# Altium schematic symbol library Analog Devices Operational Amplifiers.SchLib: 2102 symbols (part 18 of 35) (continued)
## AD8624ACPZ-R7
designator U?
Quad Channel Low Offset Voltage Operational Amplifier, 560 KHz BW, 480 mV/us SR, Industrial, 16-pin QFN (CP-16-17), Reel; Generic Part Number: AD8624; Manufacturer: Analog Devices; PartNumber: AD8624ACPZ-R7; Amplifiers Per Package: 4; Input Bias Current: 45pA; Input Offset Voltage: 10uV; Iq/Amp: 215uA; Small Signal Bandwidth: 560KHz; V Span Max: 36V; V Span Min: 4V; DatasheetVersion: Rev. C; PackageVersion: 08-16-2010-C; PackageReference: CP-16-17; PackageDescription: 16-Pin Lead Frame Chip Scale Package, Body 4 x 4 mm, Pitch 0.65 mm; Supplier 1: Digi-Key; Supplier Part Number 1: AD8624ACPZ-R7-ND; Supplier 2: Newark; Supplier Part Number 2: 67R2269; Packing: Reel; Slew Rate: 480mV/us; Mounting Technology: Surface Mount; Code_JEDEC: MO-220-WGGC; ComponentLink1Description: Manufacturer URL; ComponentLink1URL: http://www.analog.com/en/index.html; ComponentLink2Description: Datasheet; ComponentLink2URL: http://www.analog.com/static/imported-files/data_sheets/AD8622_8624.pdf; ComponentLink3Description: Package Specification; ComponentLink3URL: http://www.analog.com/static/imported-files/packages/PKG_PDF/LFCSP(CP)/CP_16_17.pdf
footprint ADI-CP-16-17_N (QFN, 16-Leads, Body 4x4mm, Pitch 0.65mm, Thermal Pad 2.60x2.60mm, IPC Medium Density)
footprint ADI-CP-16-17_L (QFN, 16-Leads, Body 4x4mm, Pitch 0.65mm, Thermal Pad 2.60x2.60mm, IPC High Density)
footprint ADI-CP-16-17_M (QFN, 16-Leads, Body 4x4mm, Pitch 0.65mm, Thermal Pad 2.60x2.60mm, IPC Low Density)
part A pins: 1 -IN A (in), 2 +IN A (in), 15 OUT A (out)
part B pins: 4 +IN B (in), 5 -IN B (in), 6 OUT B (out)
part C pins: 7 OUT C (out), 8 -IN C (in), 9 +IN C (in)
part D pins: 11 +IN D (in), 12 -IN D (in), 14 OUT D (out)
part E pins: 3 +V (power), 10 -V (power), 13 NC, 16 NC, 17 EP (power) "IT IS RECOMMENDED THAT THE EXPOSED PAD BE CONNECTED TO V-."

## AD8624ACPZ-RL
designator U?
Quad Channel Low Offset Voltage Operational Amplifier, 560 KHz BW, 480 mV/us SR, Industrial, 16-pin QFN (CP-16-17), Reel; Generic Part Number: AD8624; Manufacturer: Analog Devices; PartNumber: AD8624ACPZ-RL; Amplifiers Per Package: 4; Input Bias Current: 45pA; Input Offset Voltage: 10uV; Iq/Amp: 215uA; Small Signal Bandwidth: 560KHz; V Span Max: 36V; V Span Min: 4V; DatasheetVersion: Rev. C; PackageVersion: 08-16-2010-C; PackageReference: CP-16-17; PackageDescription: 16-Pin Lead Frame Chip Scale Package, Body 4 x 4 mm, Pitch 0.65 mm; Supplier 1: Digi-Key; Supplier Part Number 1: AD8624ACPZ-RL-ND; Supplier 2: Newark; Supplier Part Number 2: 67R2267; Packing: Reel; Slew Rate: 480mV/us; Mounting Technology: Surface Mount; Code_JEDEC: MO-220-WGGC; ComponentLink1Description: Manufacturer URL; ComponentLink1URL: http://www.analog.com/en/index.html; ComponentLink2Description: Datasheet; ComponentLink2URL: http://www.analog.com/static/imported-files/data_sheets/AD8622_8624.pdf; ComponentLink3Description: Package Specification; ComponentLink3URL: http://www.analog.com/static/imported-files/packages/PKG_PDF/LFCSP(CP)/CP_16_17.pdf
footprint ADI-CP-16-17_N (QFN, 16-Leads, Body 4x4mm, Pitch 0.65mm, Thermal Pad 2.60x2.60mm, IPC Medium Density)
footprint ADI-CP-16-17_L (QFN, 16-Leads, Body 4x4mm, Pitch 0.65mm, Thermal Pad 2.60x2.60mm, IPC High Density)
footprint ADI-CP-16-17_M (QFN, 16-Leads, Body 4x4mm, Pitch 0.65mm, Thermal Pad 2.60x2.60mm, IPC Low Density)
part A pins: 1 -IN A (in), 2 +IN A (in), 15 OUT A (out)
part B pins: 4 +IN B (in), 5 -IN B (in), 6 OUT B (out)
part C pins: 7 OUT C (out), 8 -IN C (in), 9 +IN C (in)
part D pins: 11 +IN D (in), 12 -IN D (in), 14 OUT D (out)
part E pins: 3 +V (power), 10 -V (power), 13 NC, 16 NC, 17 EP (power) "IT IS RECOMMENDED THAT THE EXPOSED PAD BE CONNECTED TO V-."

## AD8624ARUZ
designator U?
Quad Channel Low Offset Voltage Operational Amplifier, 560 KHz BW, 480 mV/us SR, Industrial, 14-pin SOP (RU-14), Tube; Generic Part Number: AD8624; Manufacturer: Analog Devices; PartNumber: AD8624ARUZ; Amplifiers Per Package: 4; Input Bias Current: 45pA; Input Offset Voltage: 10uV; Iq/Amp: 215uA; Small Signal Bandwidth: 560KHz; V Span Max: 36V; V Span Min: 4V; DatasheetVersion: Rev. C; PackageReference: RU-14; PackageDescription: 14-Pin Thin Shrink Small Outline Package, Body 5 x 4.4 mm, Pitch 0.65 mm; Supplier 1: Digi-Key; Supplier Part Number 1: AD8624ARUZ-ND; Supplier 2: Farnell; Supplier Part Number 2: 1827371; Supplier 3: Newark; Supplier Part Number 3: 67R2270; Packing: Tube; Slew Rate: 480mV/us; Mounting Technology: Surface Mount; Code_JEDEC: MO-153AB-1; ComponentLink1Description: Manufacturer URL; ComponentLink1URL: http://www.analog.com/en/index.html; ComponentLink2Description: Datasheet; ComponentLink2URL: http://www.analog.com/static/imported-files/data_sheets/AD8622_8624.pdf; ComponentLink3Description: Package Specification; ComponentLink3URL: http://www.analog.com/static/imported-files/packages/36057385283879153717235186773RU14.pdf
footprint ADI-RU-14_N (SOP, 14-Leads, Body 5x4.4mm, Pitch 0.65mm, IPC Medium Density)
footprint ADI-RU-14_L (SOP, 14-Leads, Body 5x4.4mm, Pitch 0.65mm, IPC High Density)
footprint ADI-RU-14_M (SOP, 14-Leads, Body 5x4.4mm, Pitch 0.65mm, IPC Low Density)
pins on every part: 4 +V (power), 11 -V (power)
part A pins: 1 OUT A (out), 2 -IN A (in), 3 +IN A (in)
part B pins: 5 +IN B (in), 6 -IN B (in), 7 OUT B (out)
part C pins: 8 OUT C (out), 9 -IN C (in), 10 +IN C (in)
part D pins: 12 +IN D (in), 13 -IN D (in), 14 OUT D (out)

## AD8624ARUZ-RL
designator U?
Quad Channel Low Offset Voltage Operational Amplifier, 560 KHz BW, 480 mV/us SR, Industrial, 14-pin SOP (RU-14), Reel; Generic Part Number: AD8624; Manufacturer: Analog Devices; PartNumber: AD8624ARUZ-RL; Amplifiers Per Package: 4; Input Bias Current: 45pA; Input Offset Voltage: 10uV; Iq/Amp: 215uA; Small Signal Bandwidth: 560KHz; V Span Max: 36V; V Span Min: 4V; DatasheetVersion: Rev. C; PackageReference: RU-14; PackageDescription: 14-Pin Thin Shrink Small Outline Package, Body 5 x 4.4 mm, Pitch 0.65 mm; Supplier 1: Digi-Key; Supplier Part Number 1: AD8624ARUZ-RL-ND; Supplier 2: Newark; Supplier Part Number 2: 67R2271; Packing: Reel; Slew Rate: 480mV/us; Mounting Technology: Surface Mount; Code_JEDEC: MO-153AB-1; ComponentLink1Description: Manufacturer URL; ComponentLink1URL: http://www.analog.com/en/index.html; ComponentLink2Description: Datasheet; ComponentLink2URL: http://www.analog.com/static/imported-files/data_sheets/AD8622_8624.pdf; ComponentLink3Description: Package Specification; ComponentLink3URL: http://www.analog.com/static/imported-files/packages/36057385283879153717235186773RU14.pdf
footprint ADI-RU-14_N (SOP, 14-Leads, Body 5x4.4mm, Pitch 0.65mm, IPC Medium Density)
footprint ADI-RU-14_L (SOP, 14-Leads, Body 5x4.4mm, Pitch 0.65mm, IPC High Density)
footprint ADI-RU-14_M (SOP, 14-Leads, Body 5x4.4mm, Pitch 0.65mm, IPC Low Density)
pins on every part: 4 +V (power), 11 -V (power)
part A pins: 1 OUT A (out), 2 -IN A (in), 3 +IN A (in)
part B pins: 5 +IN B (in), 6 -IN B (in), 7 OUT B (out)
part C pins: 8 OUT C (out), 9 -IN C (in), 10 +IN C (in)
part D pins: 12 +IN D (in), 13 -IN D (in), 14 OUT D (out)

## AD8625ARUZ
designator U?
Quad Channel Very Low Input Bias Current Operational Amplifier, 5 MHz BW, 5 V/us SR, Industrial, 14-pin SOP (RU-14), Tube; Generic Part Number: AD8625; Manufacturer: Analog Devices; PartNumber: AD8625ARUZ; Amplifiers Per Package: 4; Input Bias Current: 250fA; Input Offset Voltage: 50uV; Iq/Amp: 850uA; Slew Rate: 5V/us; Small Signal Bandwidth: 5MHz; V Span Max: 26V; V Span Min: 5V; DatasheetVersion: Rev. E; PackageReference: RU-14; PackageDescription: 14-Pin Thin Shrink Small Outline Package, Body 5 x 4.4 mm, Pitch 0.65 mm; Supplier 1: Digi-Key; Supplier Part Number 1: AD8625ARUZ-ND; Supplier 2: Newark; Supplier Part Number 2: 59K6979; Mounting Technology: Surface Mount; Code_JEDEC: MO-153AB-1; ComponentLink1Description: Manufacturer URL; ComponentLink1URL: http://www.analog.com/en/index.html; ComponentLink2Description: Datasheet; ComponentLink2URL: http://www.analog.com/static/imported-files/data_sheets/AD8625_8626_8627.pdf; ComponentLink3Description: Package Specification; ComponentLink3URL: http://www.analog.com/static/imported-files/packages/36057385283879153717235186773RU14.pdf
footprint ADI-RU-14_N (SOP, 14-Leads, Body 5x4.4mm, Pitch 0.65mm, IPC Medium Density)
footprint ADI-RU-14_L (SOP, 14-Leads, Body 5x4.4mm, Pitch 0.65mm, IPC High Density)
footprint ADI-RU-14_M (SOP, 14-Leads, Body 5x4.4mm, Pitch 0.65mm, IPC Low Density)
pins on every part: 4 +V (power), 11 -V (power)
part A pins: 1 OUT A (out), 2 -IN A (in), 3 +IN A (in)
part B pins: 5 +IN B (in), 6 -IN B (in), 7 OUT B (out)
part C pins: 8 OUT C (out), 9 -IN C (in), 10 +IN C (in)
part D pins: 12 +IN D (in), 13 -IN D (in), 14 OUT D (out)

## AD8625ARUZ-REEL
designator U?
Quad Channel Very Low Input Bias Current Operational Amplifier, 5 MHz BW, 5 V/us SR, Industrial, 14-pin SOP (RU-14), Reel; Generic Part Number: AD8625; Manufacturer: Analog Devices; PartNumber: AD8625ARUZ-REEL; Amplifiers Per Package: 4; Input Bias Current: 250fA; Input Offset Voltage: 50uV; Iq/Amp: 850uA; Slew Rate: 5V/us; Small Signal Bandwidth: 5MHz; V Span Max: 26V; V Span Min: 5V; DatasheetVersion: Rev. E; PackageReference: RU-14; PackageDescription: 14-Pin Thin Shrink Small Outline Package, Body 5 x 4.4 mm, Pitch 0.65 mm; Supplier 1: Digi-Key; Supplier Part Number 1: AD8625ARUZ-REEL-ND; Mounting Technology: Surface Mount; Code_JEDEC: MO-153AB-1; ComponentLink1Description: Manufacturer URL; ComponentLink1URL: http://www.analog.com/en/index.html; ComponentLink2Description: Datasheet; ComponentLink2URL: http://www.analog.com/static/imported-files/data_sheets/AD8625_8626_8627.pdf; ComponentLink3Description: Package Specification; ComponentLink3URL: http://www.analog.com/static/imported-files/packages/36057385283879153717235186773RU14.pdf
footprint ADI-RU-14_N (SOP, 14-Leads, Body 5x4.4mm, Pitch 0.65mm, IPC Medium Density)
footprint ADI-RU-14_L (SOP, 14-Leads, Body 5x4.4mm, Pitch 0.65mm, IPC High Density)
footprint ADI-RU-14_M (SOP, 14-Leads, Body 5x4.4mm, Pitch 0.65mm, IPC Low Density)
pins on every part: 4 +V (power), 11 -V (power)
part A pins: 1 OUT A (out), 2 -IN A (in), 3 +IN A (in)
part B pins: 5 +IN B (in), 6 -IN B (in), 7 OUT B (out)
part C pins: 8 OUT C (out), 9 -IN C (in), 10 +IN C (in)
part D pins: 12 +IN D (in), 13 -IN D (in), 14 OUT D (out)

## AD8625ARZ
designator U?
Quad Channel Very Low Input Bias Current Operational Amplifier, 5 MHz BW, 5 V/us SR, Industrial, 14-pin SOIC (R-14), Tube; Generic Part Number: AD8625; Manufacturer: Analog Devices; PartNumber: AD8625ARZ; Amplifiers Per Package: 4; Input Bias Current: 250fA; Input Offset Voltage: 50uV; Iq/Amp: 850uA; Slew Rate: 5V/us; Small Signal Bandwidth: 5MHz; V Span Max: 26V; V Span Min: 5V; DatasheetVersion: Rev. E; PackageVersion: 060606-A; PackageReference: R-14; PackageDescription: 14-Pin Standard Small Outline Package, Body 8.65 x 3.9 mm, Pitch 1.27 mm; Supplier 1: Digi-Key; Supplier Part Number 1: AD8625ARZ-ND; Supplier 2: Farnell; Supplier Part Number 2: 1581953; Supplier 3: Newark; Supplier Part Number 3: 59K6981; Mounting Technology: Surface Mount; Code_JEDEC: MS-012-AB; ComponentLink1Description: Manufacturer URL; ComponentLink1URL: http://www.analog.com/en/index.html; ComponentLink2Description: Datasheet; ComponentLink2URL: http://www.analog.com/static/imported-files/data_sheets/AD8625_8626_8627.pdf; ComponentLink3Description: Package Specification; ComponentLink3URL: http://www.analog.com/static/imported-files/packages/PKG_PDF/SOIC_Narrow%20(R)/R_14.pdf
footprint ADI-R-14_N (SOIC, 14-Leads, Body 8.65x3.9mm, Pitch 1.27mm, IPC Medium Density)
footprint ADI-R-14_L (SOIC, 14-Leads, Body 8.65x3.9mm, Pitch 1.27mm, IPC High Density)
footprint ADI-R-14_M (SOIC, 14-Leads, Body 8.65x3.9mm, Pitch 1.27mm, IPC Low Density)
pins on every part: 4 +V (power), 11 -V (power)
part A pins: 1 OUT A (out), 2 -IN A (in), 3 +IN A (in)
part B pins: 5 +IN B (in), 6 -IN B (in), 7 OUT B (out)
part C pins: 8 OUT C (out), 9 -IN C (in), 10 +IN C (in)
part D pins: 12 +IN D (in), 13 -IN D (in), 14 OUT D (out)

## AD8625ARZ-REEL
designator U?
Quad Channel Very Low Input Bias Current Operational Amplifier, 5 MHz BW, 5 V/us SR, Industrial, 14-pin SOIC (R-14), Reel; Generic Part Number: AD8625; Manufacturer: Analog Devices; PartNumber: AD8625ARZ-REEL; Amplifiers Per Package: 4; Input Bias Current: 250fA; Input Offset Voltage: 50uV; Iq/Amp: 850uA; Slew Rate: 5V/us; Small Signal Bandwidth: 5MHz; V Span Max: 26V; V Span Min: 5V; DatasheetVersion: Rev. E; PackageVersion: 060606-A; PackageReference: R-14; PackageDescription: 14-Pin Standard Small Outline Package, Body 8.65 x 3.9 mm, Pitch 1.27 mm; Supplier 1: Digi-Key; Supplier Part Number 1: AD8625ARZ-REEL-ND; Mounting Technology: Surface Mount; Code_JEDEC: MS-012-AB; ComponentLink1Description: Manufacturer URL; ComponentLink1URL: http://www.analog.com/en/index.html; ComponentLink2Description: Datasheet; ComponentLink2URL: http://www.analog.com/static/imported-files/data_sheets/AD8625_8626_8627.pdf; ComponentLink3Description: Package Specification; ComponentLink3URL: http://www.analog.com/static/imported-files/packages/PKG_PDF/SOIC_Narrow%20(R)/R_14.pdf
footprint ADI-R-14_N (SOIC, 14-Leads, Body 8.65x3.9mm, Pitch 1.27mm, IPC Medium Density)
footprint ADI-R-14_L (SOIC, 14-Leads, Body 8.65x3.9mm, Pitch 1.27mm, IPC High Density)
footprint ADI-R-14_M (SOIC, 14-Leads, Body 8.65x3.9mm, Pitch 1.27mm, IPC Low Density)
pins on every part: 4 +V (power), 11 -V (power)
part A pins: 1 OUT A (out), 2 -IN A (in), 3 +IN A (in)
part B pins: 5 +IN B (in), 6 -IN B (in), 7 OUT B (out)
part C pins: 8 OUT C (out), 9 -IN C (in), 10 +IN C (in)
part D pins: 12 +IN D (in), 13 -IN D (in), 14 OUT D (out)

## AD8625ARZ-REEL7
designator U?
Quad Channel Very Low Input Bias Current Operational Amplifier, 5 MHz BW, 5 V/us SR, Industrial, 14-pin SOIC (R-14), Reel; Generic Part Number: AD8625; Manufacturer: Analog Devices; PartNumber: AD8625ARZ-REEL7; Amplifiers Per Package: 4; Input Bias Current: 250fA; Input Offset Voltage: 50uV; Iq/Amp: 850uA; Slew Rate: 5V/us; Small Signal Bandwidth: 5MHz; V Span Max: 26V; V Span Min: 5V; DatasheetVersion: Rev. E; PackageVersion: 060606-A; PackageReference: R-14; PackageDescription: 14-Pin Standard Small Outline Package, Body 8.65 x 3.9 mm, Pitch 1.27 mm; Supplier 1: Digi-Key; Supplier Part Number 1: AD8625ARZ-REEL7-ND; Mounting Technology: Surface Mount; Code_JEDEC: MS-012-AB; ComponentLink1Description: Manufacturer URL; ComponentLink1URL: http://www.analog.com/en/index.html; ComponentLink2Description: Datasheet; ComponentLink2URL: http://www.analog.com/static/imported-files/data_sheets/AD8625_8626_8627.pdf; ComponentLink3Description: Package Specification; ComponentLink3URL: http://www.analog.com/static/imported-files/packages/PKG_PDF/SOIC_Narrow%20(R)/R_14.pdf
footprint ADI-R-14_N (SOIC, 14-Leads, Body 8.65x3.9mm, Pitch 1.27mm, IPC Medium Density)
footprint ADI-R-14_L (SOIC, 14-Leads, Body 8.65x3.9mm, Pitch 1.27mm, IPC High Density)
footprint ADI-R-14_M (SOIC, 14-Leads, Body 8.65x3.9mm, Pitch 1.27mm, IPC Low Density)
pins on every part: 4 +V (power), 11 -V (power)
part A pins: 1 OUT A (out), 2 -IN A (in), 3 +IN A (in)
part B pins: 5 +IN B (in), 6 -IN B (in), 7 OUT B (out)
part C pins: 8 OUT C (out), 9 -IN C (in), 10 +IN C (in)
part D pins: 12 +IN D (in), 13 -IN D (in), 14 OUT D (out)

## AD8626ARMZ
designator U?
Double Channel Very Low Input Bias Current Operational Amplifier, 5 MHz BW, 5 V/us SR, Industrial, 8-pin SOP (RM-8), Tube; Generic Part Number: AD8626; Manufacturer: Analog Devices; PartNumber: AD8626ARMZ; Amplifiers Per Package: 2; Input Bias Current: 250fA; Input Offset Voltage: 50uV; Iq/Amp: 850uA; Slew Rate: 5V/us; Small Signal Bandwidth: 5MHz; V Span Max: 26V; V Span Min: 5V; DatasheetVersion: Rev. E; PackageReference: RM-8; PackageDescription: 8-Pin Mini Small Outline Package, Body 3 x 3 mm, Pitch 0.65 mm; Supplier 1: Digi-Key; Supplier Part Number 1: AD8626ARMZ-ND; Supplier 2: Newark; Supplier Part Number 2: 45P6467; Mounting Technology: Surface Mount; Code_JEDEC: MO-187-AA; ComponentLink1Description: Manufacturer URL; ComponentLink1URL: http://www.analog.com/en/index.html; ComponentLink2Description: Datasheet; ComponentLink2URL: http://www.analog.com/static/imported-files/data_sheets/AD8625_8626_8627.pdf; ComponentLink3Description: Package Specification; ComponentLink3URL: http://www.analog.com/static/imported-files/packages/PKG_PDF/MSOP%28RM%29/RM_8.pdf
footprint ADI-RM-8_N (SOP, 8-Leads, Body 3x3mm, Pitch 0.65mm, IPC Medium Density)
footprint ADI-RM-8_L (SOP, 8-Leads, Body 3x3mm, Pitch 0.65mm, IPC High Density)
footprint ADI-RM-8_M (SOP, 8-Leads, Body 3x3mm, Pitch 0.65mm, IPC Low Density)
pins on every part: 4 -V (power), 8 +V (power)
part A pins: 1 OUT A (out), 2 -IN A (in), 3 +IN A (in)
part B pins: 5 +IN B (in), 6 -IN B (in), 7 OUT B (out)

## AD8626ARMZ-REEL
designator U?
Double Channel Very Low Input Bias Current Operational Amplifier, 5 MHz BW, 5 V/us SR, Industrial, 8-pin SOP (RM-8), Reel; Generic Part Number: AD8626; Manufacturer: Analog Devices; PartNumber: AD8626ARMZ-REEL; Amplifiers Per Package: 2; Input Bias Current: 250fA; Input Offset Voltage: 50uV; Iq/Amp: 850uA; Slew Rate: 5V/us; Small Signal Bandwidth: 5MHz; V Span Max: 26V; V Span Min: 5V; DatasheetVersion: Rev. E; PackageReference: RM-8; PackageDescription: 8-Pin Mini Small Outline Package, Body 3 x 3 mm, Pitch 0.65 mm; Supplier 1: Digi-Key; Supplier Part Number 1: AD8626ARMZ-REELTR-ND; Supplier 2: Digi-Key; Supplier Part Number 2: AD8626ARMZ-REELCT-ND; Supplier 3: Digi-Key; Supplier Part Number 3: AD8626ARMZ-REELDKR-ND; Supplier 4: Newark; Supplier Part Number 4: 59K6984; Mounting Technology: Surface Mount; Code_JEDEC: MO-187-AA; ComponentLink1Description: Manufacturer URL; ComponentLink1URL: http://www.analog.com/en/index.html; ComponentLink2Description: Datasheet; ComponentLink2URL: http://www.analog.com/static/imported-files/data_sheets/AD8625_8626_8627.pdf; ComponentLink3Description: Package Specification; ComponentLink3URL: http://www.analog.com/static/imported-files/packages/PKG_PDF/MSOP%28RM%29/RM_8.pdf
footprint ADI-RM-8_N (SOP, 8-Leads, Body 3x3mm, Pitch 0.65mm, IPC Medium Density)
footprint ADI-RM-8_L (SOP, 8-Leads, Body 3x3mm, Pitch 0.65mm, IPC High Density)
footprint ADI-RM-8_M (SOP, 8-Leads, Body 3x3mm, Pitch 0.65mm, IPC Low Density)
pins on every part: 4 -V (power), 8 +V (power)
part A pins: 1 OUT A (out), 2 -IN A (in), 3 +IN A (in)
part B pins: 5 +IN B (in), 6 -IN B (in), 7 OUT B (out)

## AD8626ARZ
designator U?
Double Channel Very Low Input Bias Current Operational Amplifier, 5 MHz BW, 5 V/us SR, Industrial, 8-pin SOIC (R-8), Tube; Generic Part Number: AD8626; Manufacturer: Analog Devices; PartNumber: AD8626ARZ; Amplifiers Per Package: 2; Input Bias Current: 250fA; Input Offset Voltage: 50uV; Iq/Amp: 850uA; Slew Rate: 5V/us; Small Signal Bandwidth: 5MHz; V Span Max: 26V; V Span Min: 5V; DatasheetVersion: Rev. E; PackageVersion: 060506-A; PackageReference: R-8; PackageDescription: 8-Pin Standard Small Outline Package, Body 3.9 x 4.9 mm, Pitch 1.27 mm; Supplier 1: Digi-Key; Supplier Part Number 1: AD8626ARZ-ND; Supplier 2: Farnell; Supplier Part Number 2: 1581954; Supplier 3: Newark; Supplier Part Number 3: 59K6986; Mounting Technology: Surface Mount; Code_JEDEC: MS-012-AA; ComponentLink1Description: Manufacturer URL; ComponentLink1URL: http://www.analog.com/en/index.html; ComponentLink2Description: Datasheet; ComponentLink2URL: http://www.analog.com/static/imported-files/data_sheets/AD8625_8626_8627.pdf; ComponentLink3Description: Package Specification; ComponentLink3URL: http://www.analog.com/static/imported-files/packages/PKG_PDF/SOIC_Narrow%20(R)/R_8.pdf
footprint ADI-R-8_N (SOIC, 8-Leads, Body 4.9x3.9mm, Pitch 1.27mm, IPC Medium Density)
footprint ADI-R-8_L (SOIC, 8-Leads, Body 4.9x3.9mm, Pitch 1.27mm, IPC High Density)
footprint ADI-R-8_M (SOIC, 8-Leads, Body 4.9x3.9mm, Pitch 1.27mm, IPC Low Density)
pins on every part: 4 -V (power), 8 +V (power)
part A pins: 1 OUT A (out), 2 -IN A (in), 3 +IN A (in)
part B pins: 5 +IN B (in), 6 -IN B (in), 7 OUT B (out)

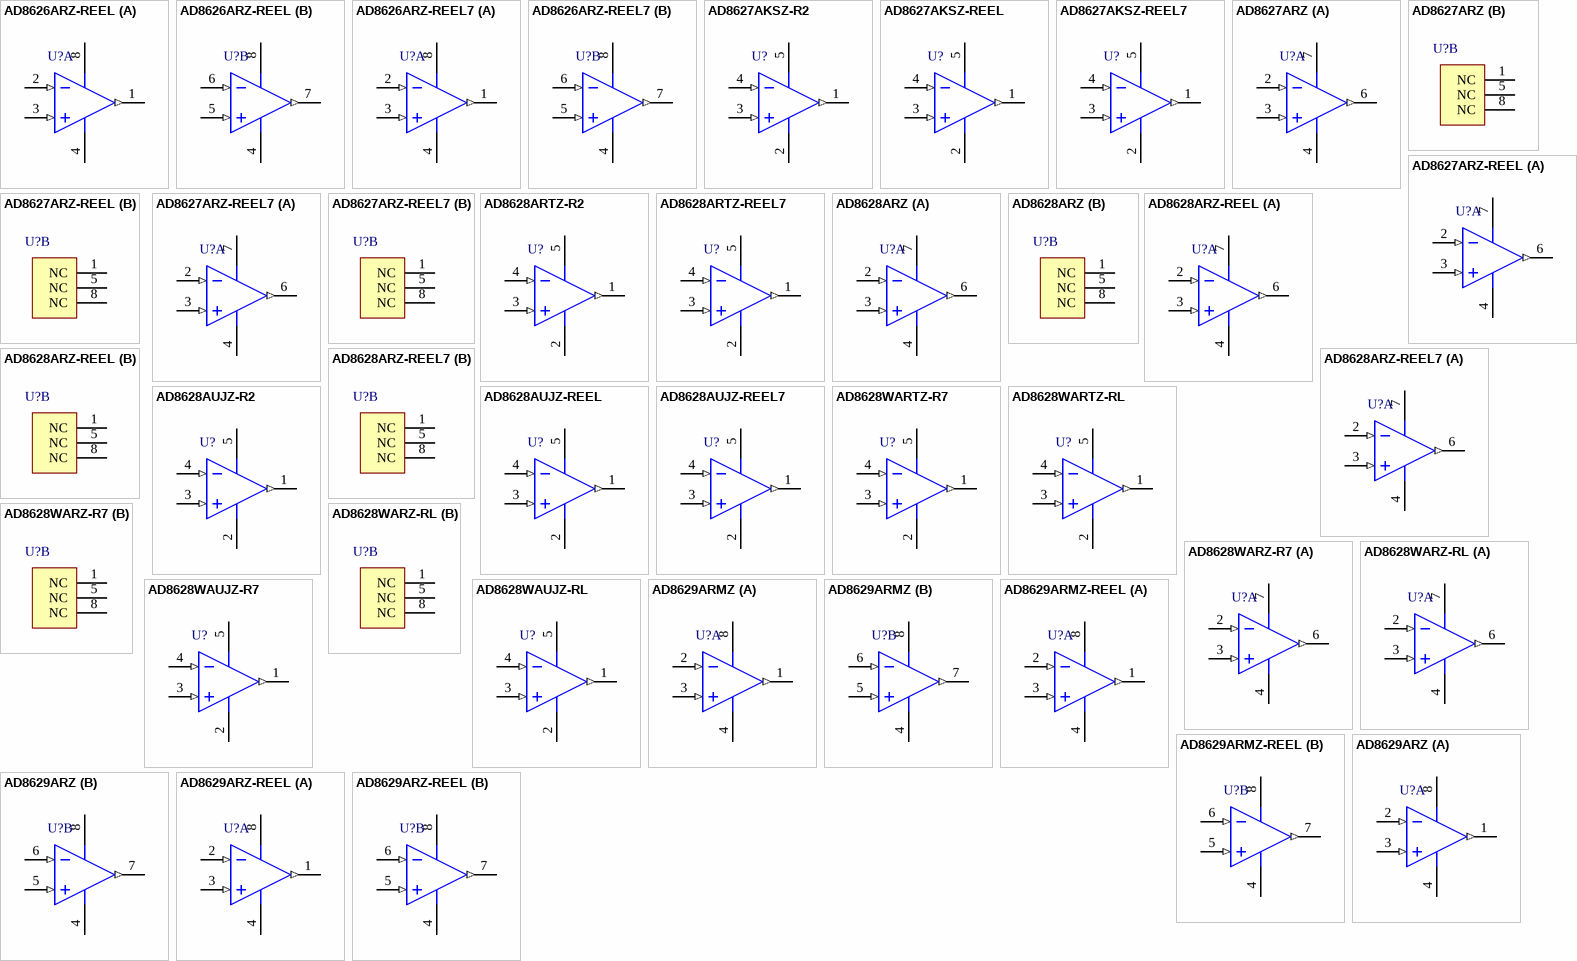
[diagram p56: symbols AD8626ARZ-REEL to AD8629ARZ-REEL]

## AD8626ARZ-REEL
designator U?
Double Channel Very Low Input Bias Current Operational Amplifier, 5 MHz BW, 5 V/us SR, Industrial, 8-pin SOIC (R-8), Reel; Generic Part Number: AD8626; Manufacturer: Analog Devices; PartNumber: AD8626ARZ-REEL; Amplifiers Per Package: 2; Input Bias Current: 250fA; Input Offset Voltage: 50uV; Iq/Amp: 850uA; Slew Rate: 5V/us; Small Signal Bandwidth: 5MHz; V Span Max: 26V; V Span Min: 5V; DatasheetVersion: Rev. E; PackageVersion: 060506-A; PackageReference: R-8; PackageDescription: 8-Pin Standard Small Outline Package, Body 3.9 x 4.9 mm, Pitch 1.27 mm; Supplier 1: Digi-Key; Supplier Part Number 1: AD8626ARZ-REEL-ND; Supplier 2: Newark; Supplier Part Number 2: 59K6987; Mounting Technology: Surface Mount; Code_JEDEC: MS-012-AA; ComponentLink1Description: Manufacturer URL; ComponentLink1URL: http://www.analog.com/en/index.html; ComponentLink2Description: Datasheet; ComponentLink2URL: http://www.analog.com/static/imported-files/data_sheets/AD8625_8626_8627.pdf; ComponentLink3Description: Package Specification; ComponentLink3URL: http://www.analog.com/static/imported-files/packages/PKG_PDF/SOIC_Narrow%20(R)/R_8.pdf
footprint ADI-R-8_N (SOIC, 8-Leads, Body 4.9x3.9mm, Pitch 1.27mm, IPC Medium Density)
footprint ADI-R-8_L (SOIC, 8-Leads, Body 4.9x3.9mm, Pitch 1.27mm, IPC High Density)
footprint ADI-R-8_M (SOIC, 8-Leads, Body 4.9x3.9mm, Pitch 1.27mm, IPC Low Density)
pins on every part: 4 -V (power), 8 +V (power)
part A pins: 1 OUT A (out), 2 -IN A (in), 3 +IN A (in)
part B pins: 5 +IN B (in), 6 -IN B (in), 7 OUT B (out)

## AD8626ARZ-REEL7
designator U?
Double Channel Very Low Input Bias Current Operational Amplifier, 5 MHz BW, 5 V/us SR, Industrial, 8-pin SOIC (R-8), Reel; Generic Part Number: AD8626; Manufacturer: Analog Devices; PartNumber: AD8626ARZ-REEL7; Amplifiers Per Package: 2; Input Bias Current: 250fA; Input Offset Voltage: 50uV; Iq/Amp: 850uA; Slew Rate: 5V/us; Small Signal Bandwidth: 5MHz; V Span Max: 26V; V Span Min: 5V; DatasheetVersion: Rev. E; PackageVersion: 060506-A; PackageReference: R-8; PackageDescription: 8-Pin Standard Small Outline Package, Body 3.9 x 4.9 mm, Pitch 1.27 mm; Supplier 1: Digi-Key; Supplier Part Number 1: AD8626ARZ-REEL7TR-ND; Supplier 2: Digi-Key; Supplier Part Number 2: AD8626ARZ-REEL7CT-ND; Supplier 3: Digi-Key; Supplier Part Number 3: AD8626ARZ-REEL7DKR-ND; Mounting Technology: Surface Mount; Code_JEDEC: MS-012-AA; ComponentLink1Description: Manufacturer URL; ComponentLink1URL: http://www.analog.com/en/index.html; ComponentLink2Description: Datasheet; ComponentLink2URL: http://www.analog.com/static/imported-files/data_sheets/AD8625_8626_8627.pdf; ComponentLink3Description: Package Specification; ComponentLink3URL: http://www.analog.com/static/imported-files/packages/PKG_PDF/SOIC_Narrow%20(R)/R_8.pdf
footprint ADI-R-8_N (SOIC, 8-Leads, Body 4.9x3.9mm, Pitch 1.27mm, IPC Medium Density)
footprint ADI-R-8_L (SOIC, 8-Leads, Body 4.9x3.9mm, Pitch 1.27mm, IPC High Density)
footprint ADI-R-8_M (SOIC, 8-Leads, Body 4.9x3.9mm, Pitch 1.27mm, IPC Low Density)
pins on every part: 4 -V (power), 8 +V (power)
part A pins: 1 OUT A (out), 2 -IN A (in), 3 +IN A (in)
part B pins: 5 +IN B (in), 6 -IN B (in), 7 OUT B (out)

## AD8627AKSZ-R2
designator U?
Single Channel Very Low Input Bias Current Operational Amplifier, 5 MHz BW, 5 V/us SR, Industrial, 5-pin SOT23 (KS-5), Reel; Generic Part Number: AD8627; Manufacturer: Analog Devices; PartNumber: AD8627AKSZ-R2; Amplifiers Per Package: 1; Input Bias Current: 250fA; Input Offset Voltage: 50uV; Iq/Amp: 850uA; Slew Rate: 5V/us; Small Signal Bandwidth: 5MHz; V Span Max: 26V; V Span Min: 5V; DatasheetVersion: Rev. E; PackageVersion: 072809-A; PackageReference: KS-5; PackageDescription: 5-Pin Thin Shrink Small Outline Transistor Package, Body 2 x 1.25 mm, Pitch 0.65 mm; Supplier 1: Digi-Key; Supplier Part Number 1: AD8627AKSZ-R2TR-ND; Supplier 2: Digi-Key; Supplier Part Number 2: AD8627AKSZ-R2CT-ND; Supplier 3: Digi-Key; Supplier Part Number 3: AD8627AKSZ-R2DKR-ND; Supplier 4: Farnell; Supplier Part Number 4: 1838871; Supplier 5: Newark; Supplier Part Number 5: 19M8933; Mounting Technology: Surface Mount; Code_JEDEC: MO-203-AA; ComponentLink1Description: Manufacturer URL; ComponentLink1URL: http://www.analog.com/en/index.html; ComponentLink2Description: Datasheet; ComponentLink2URL: http://www.analog.com/static/imported-files/data_sheets/AD8625_8626_8627.pdf; ComponentLink3Description: Package Specification; ComponentLink3URL: http://www.analog.com/static/imported-files/packages/PKG_PDF/SC70(KS)/KS_5.pdf; ComponentLink4Description: Reference Circuit; ComponentLink4URL: http://www.analog.com/en/all-operational-amplifiers-op-amps/operational-amplifiers-op-amps/ad8627/products/product.html#product-recommendations
footprint ADI-KS-5_N (SOT23, 5-Leads, Body 2x1.25mm, Pitch 0.65mm, IPC Medium Density)
footprint ADI-KS-5_L (SOT23, 5-Leads, Body 2x1.25mm, Pitch 0.65mm, IPC High Density)
footprint ADI-KS-5_M (SOT23, 5-Leads, Body 2x1.25mm, Pitch 0.65mm, IPC Low Density)
pins: 1 OUT A (out), 2 -V (power), 3 +IN (in), 4 -IN (in), 5 +V (power)

## AD8627AKSZ-REEL
designator U?
Single Channel Very Low Input Bias Current Operational Amplifier, 5 MHz BW, 5 V/us SR, Industrial, 5-pin SOT23 (KS-5), Reel; Generic Part Number: AD8627; Manufacturer: Analog Devices; PartNumber: AD8627AKSZ-REEL; Amplifiers Per Package: 1; Input Bias Current: 250fA; Input Offset Voltage: 50uV; Iq/Amp: 850uA; Slew Rate: 5V/us; Small Signal Bandwidth: 5MHz; V Span Max: 26V; V Span Min: 5V; DatasheetVersion: Rev. E; PackageVersion: 072809-A; PackageReference: KS-5; PackageDescription: 5-Pin Thin Shrink Small Outline Transistor Package, Body 2 x 1.25 mm, Pitch 0.65 mm; Supplier 1: Digi-Key; Supplier Part Number 1: AD8627AKSZ-REEL-ND; Supplier 2: Newark; Supplier Part Number 2: 59K6989; Mounting Technology: Surface Mount; Code_JEDEC: MO-203-AA; ComponentLink1Description: Manufacturer URL; ComponentLink1URL: http://www.analog.com/en/index.html; ComponentLink2Description: Datasheet; ComponentLink2URL: http://www.analog.com/static/imported-files/data_sheets/AD8625_8626_8627.pdf; ComponentLink3Description: Package Specification; ComponentLink3URL: http://www.analog.com/static/imported-files/packages/PKG_PDF/SC70(KS)/KS_5.pdf; ComponentLink4Description: Reference Circuit; ComponentLink4URL: http://www.analog.com/en/all-operational-amplifiers-op-amps/operational-amplifiers-op-amps/ad8627/products/product.html#product-recommendations
footprint ADI-KS-5_N (SOT23, 5-Leads, Body 2x1.25mm, Pitch 0.65mm, IPC Medium Density)
footprint ADI-KS-5_L (SOT23, 5-Leads, Body 2x1.25mm, Pitch 0.65mm, IPC High Density)
footprint ADI-KS-5_M (SOT23, 5-Leads, Body 2x1.25mm, Pitch 0.65mm, IPC Low Density)
pins: 1 OUT A (out), 2 -V (power), 3 +IN (in), 4 -IN (in), 5 +V (power)